# Altium footprint library Selex_PCBLib.PcbLib: 388 footprints (part 25 of 25)
Each footprint in its own frame and in the unit in brackets; x right, y up, seen from the top. Pads: shape width x height; smd on the part's side, far side on the other; paste and mask are expansions set on the pad; w line width, h text height; cw(c..) or ccw(c..) is an arc to the next point about the centre after c.
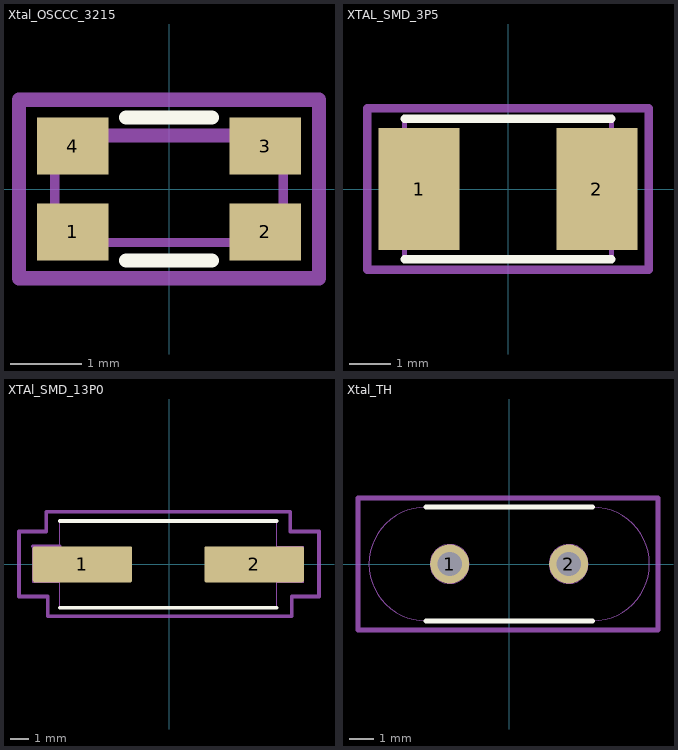
[diagram p24: the footprints below, top view; thin cyan lines are the x and y axes]

## Xtal_OSCCC_3215 [mm]
pads (4):
  rect 1x0.8 smd: 1(-1.35,-0.6) 2(1.35,-0.6) 3(1.35,0.6) 4(-1.35,0.6)
Top Overlay:
  lines w0.2: -0.6,-1 0.6,-1 ; -0.6,1 0.6,1
Mechanical 13:
  lines w0.127: -1.6,0.75 -1.6,-0.75 1.6,-0.75 1.6,0.75
  lines w0.2: -1.6,0.75 1.6,0.75
Mechanical 15:
  lines w0.2: -2.1,-1.25 2.1,-1.25 2.1,1.25 -2.1,1.25 -2.1,-1.25
3D body "step_temp.STEP": height 1, standoff 0, extent -1.6,-0.75 1.6,0.75

## XTAL_SMD_3P5 [mm] "8mhz, 16mhz, XTAL_SMD_5P0X3P5"
pads (2):
  rect 1.95x2.95 smd: 1(-2.15,0) 2(2.15,0)
Top Overlay:
  lines w0.2: -2.5,-1.7 2.5,-1.7 ; -2.5,1.7 2.5,1.7
Mechanical 13:
  lines w0.127: -2.5,-1.7 -2.5,1.7 ; 2.5,-1.7 2.5,1.7
Mechanical 15:
  lines w0.2: -3.4,-1.95 3.4,-1.95 3.4,1.95 -3.4,1.95 -3.4,-1.95
3D body "ABM3-8.000MHZ-D2Y-T--3DModel-STEP-56544.STEP": height 1.3, standoff 0, extent -2.502,-1.651 2.502,1.651

## XTAl_SMD_13P0 [mm] "8mhz ,16 mhz, XTAl_SMD_5P0X13P0"
pads (2):
  rrect10% 5.5x2 smd mask+0.1: 1(-4.79,-0.02) 2(4.71,-0.02)
Top Overlay:
  lines w0.2: -6.04,-2.42 5.96,-2.42 ; -6.04,2.38 5.96,2.38
Mechanical 1:
  lines w0.05: -7.54,0.98 -7.54,-1.02 -6.04,-1.02 -6.04,0.98 ; -6.04,-2.42 5.96,-2.42 5.96,2.38 -6.04,2.38 -6.04,-2.42 ; 5.96,-1.02 7.46,-1.02 7.46,0.98 5.96,0.98 5.96,-1.02
  lines w0.2: -7.54,0.98 -6.04,0.98
Mechanical 15:
  lines w0.2: -8.3,-1.8 -6.7,-1.8 -6.7,-2.9 6.8,-2.9 6.8,-1.8 8.3,-1.8 8.3,1.8 6.7,1.8 6.7,2.9 -5.8,2.9 -6.8,2.9 -6.8,1.8 -8.3,1.8 -8.3,-1.8
3D body "User Library-Crystal HC49_US-SM.step": height 4.3, standoff 0, extent -6.4,-2.415 6.4,2.415

## Xtal_TH [mm]
pads (2):
  round 1.6 hole 1 mask+0.1: 1(-2.44,0) 2(2.44,0)
Top Overlay:
  lines w0.2: -3.42,-2.33 3.42,-2.33 ; -3.42,2.33 3.42,2.33
Mechanical 1:
  circle w0.05: c2.44,0 r0.8
  circle w0.05: c-2.44,0 r0.8
  lines w0.05: -3.42,-2.33 cw(c-3.42,0) -3.42,2.33 3.42,2.33 cw(c3.42,0) 3.42,-2.33 -3.42,-2.33
Mechanical 15:
  lines w0.2: -6.2,-2.7 6.1,-2.7 6.1,2.7 -6.2,2.7 -6.2,-2.7
3D body "crystala.step": height 3.6, standoff -1.99, extent -5.675,-2.325 5.675,2.325